# Altium footprint library OXI_ONE.PcbLib: 74 footprints (part 5 of 5)
Each footprint in its own frame and in the unit in brackets; x right, y up, seen from the top. Pads: shape width x height; smd on the part's side, far side on the other; paste and mask are expansions set on the pad; w line width, h text height; cw(c..) or ccw(c..) is an arc to the next point about the centre after c.
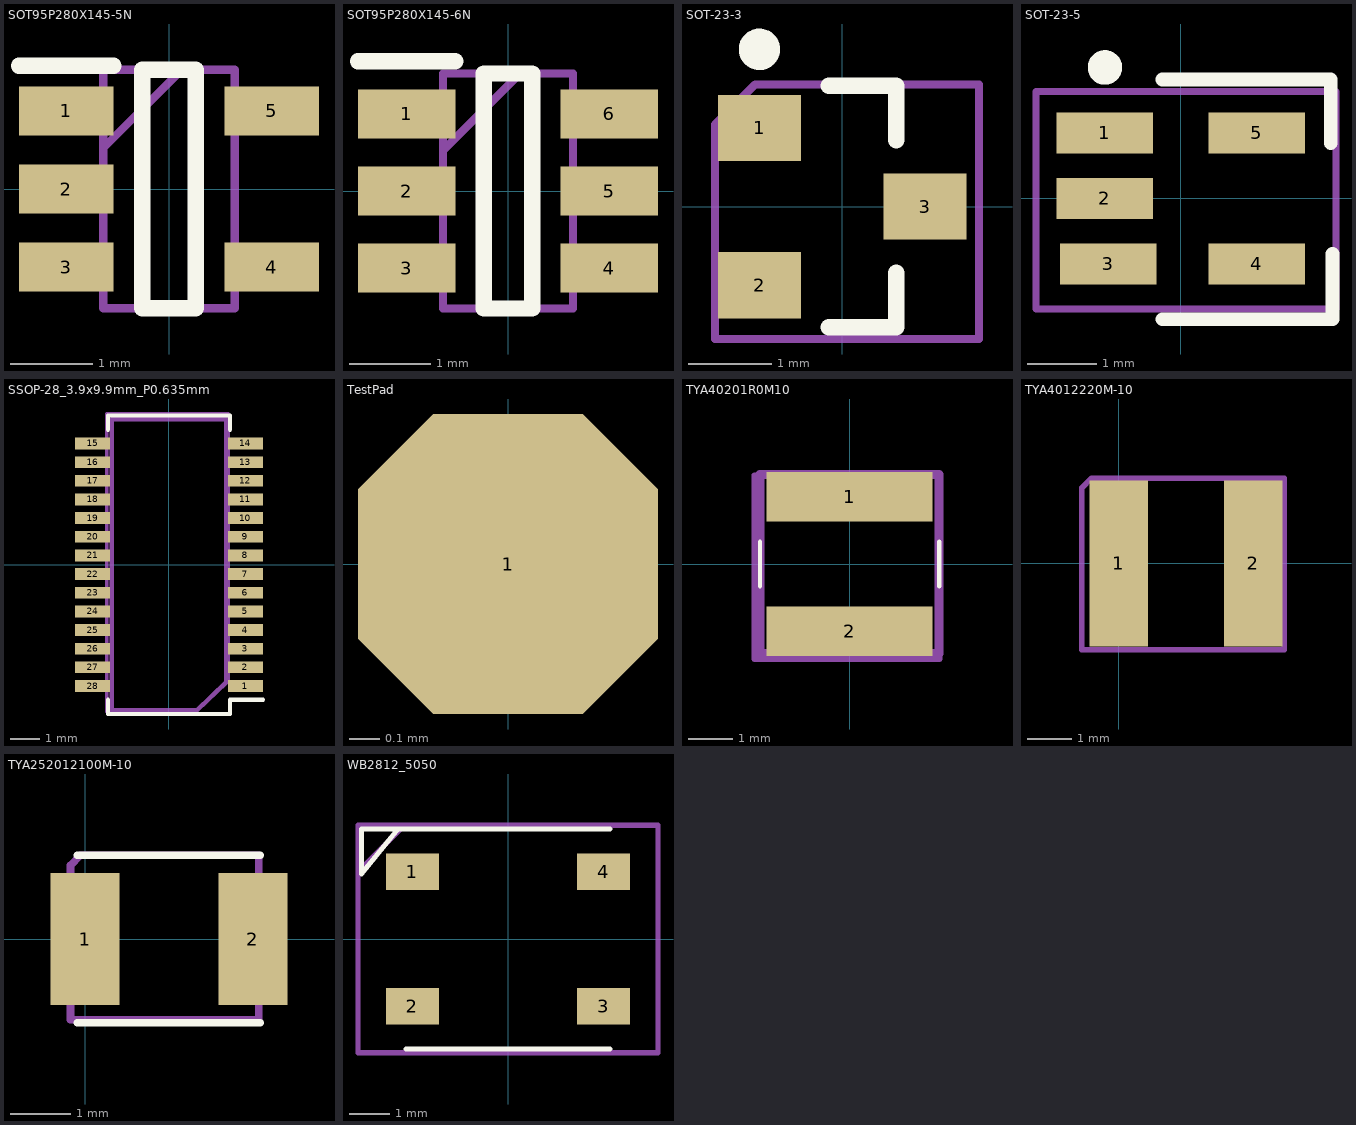
[diagram p4: the footprints below, top view; thin cyan lines are the x and y axes]

## SOT95P280X145-5N [mm]
pads (5):
  rect 1.15x0.6 smd: 1(-1.25,0.95) 2(-1.25,0) 3(-1.25,-0.95) 4(1.25,-0.95) 5(1.25,0.95)
Top Overlay:
  lines w0.2: -1.825,1.5 -0.675,1.5 ; -0.325,-1.45 -0.325,1.45 0.325,1.45 0.325,-1.45 -0.325,-1.45
Top Assembly (Mech29):
  lines w0.1: -0.8,0.5 0.15,1.45 ; -0.8,-1.45 -0.8,1.45 0.8,1.45 0.8,-1.45 -0.8,-1.45
  text ".Designator" at 0.381,-1.27 h1
3D body "MCP1811AT-020_OT.stp": height 1.45, standoff 0, extent -1.4,-1.45 1.4,1.45

## SOT95P280X145-6N [mm]
pads (6):
  rect 1.2x0.6 smd: 1(-1.25,0.95) 2(-1.25,0) 3(-1.25,-0.95) 4(1.25,-0.95) 5(1.25,0) 6(1.25,0.95)
Top Overlay:
  lines w0.2: -1.85,1.6 -0.65,1.6 ; -0.3,-1.45 0.3,-1.45 0.3,1.45 -0.3,1.45 -0.3,-1.45
Top Assembly (Mech29):
  lines w0.1: -0.8,0.5 0.15,1.45 ; -0.8,-1.45 0.8,-1.45 0.8,1.45 -0.8,1.45 -0.8,-1.45
  text ".Designator" at 0.381,-1.397 h1
3D body "TPD3S014DBVR.stp": height 1.45, standoff 0, extent -1.4,-1.45 1.4,1.45

## SOT-23-3 [mm] "SOT23, 3-Leads, Body 2.92x1.3mm, Pitch 0.95mm"
height 1.11
pads (3):
  rect 1x0.8 smd: 1(-1,0.95) 2(-1,-0.95) 3(1,0)
Top Overlay:
  circle w0.25: c-1,1.9 r0.125
  lines w0.2: -0.165,-1.46 0.65,-1.46 0.65,-0.8 ; -0.165,1.46 0.65,1.46 0.65,0.8
Top Assembly (Mech29):
  lines w0.1: -1.537,-1.6 1.651,-1.6 1.651,1.475 -1.052,1.475 -1.537,0.991 -1.537,-1.6
  text ".Designator" at -0.254,1.143 h1
3D body "SOT23-3.step": height 1.3, standoff 0, extent -1.4,-1.45 1.4,1.45

## SOT-23-5 [mm] "SOT23, 3-Leads, Body 2.92x1.3mm, Pitch 0.95mm"
height 1.11
pads (5):
  rect 1.4x0.6 smd: 1(-1.1,0.95) 2(-1.1,0) 3(-1.05,-0.95) 4(1.1,-0.95) 5(1.1,0.95)
Top Overlay:
  circle w0.25: c-1.1,1.9 r0.125
  lines w0.2: -0.265,-1.75 2.2,-1.75 2.2,-0.8 ; -0.265,1.725 2.175,1.725 2.175,0.8
Top Assembly (Mech29):
  lines w0.1: -2.1,-1.6 -2.1,1.55 2.25,1.55 2.25,-1.6 -2.1,-1.6
  text ".Designator" at -0.381,1.143 h1
3D body "SOT-23-5.step": height 1.05, standoff -0.05, extent -1.175,-1.5 1.325,1.5

## SSOP-28_3.9x9.9mm_P0.635mm [mm]
pads (28):
  rect 1.2x0.4 smd mask+0.051: 1(2.6,-4.127) 2(2.6,-3.492) 3(2.6,-2.857) 4(2.6,-2.222) 5(2.6,-1.587) 6(2.6,-0.953) 7(2.6,-0.318) 8(2.6,0.318) 9(2.6,0.953) 10(2.6,1.587) 11(2.6,2.222) 12(2.6,2.857) 13(2.6,3.492) 14(2.6,4.127) 15(-2.6,4.127) 16(-2.6,3.492) 17(-2.6,2.857) 18(-2.6,2.222) 19(-2.6,1.587) 20(-2.6,0.953) 21(-2.6,0.318) 22(-2.6,-0.318) 23(-2.6,-0.953) 24(-2.6,-1.587) 25(-2.6,-2.222) 26(-2.6,-2.857) 27(-2.6,-3.492) 28(-2.6,-4.127)
Top Overlay:
  lines w0.15: -2.075,-4.6 -2.075,-5.08 2.075,-5.08 2.075,-4.6 3.2,-4.6 ; -2.075,4.6 -2.075,5.08 2.075,5.08 2.075,4.6
Bottom Assembly:
  lines w0.15: -1.95,-4.95 0.95,-4.95 1.95,-4 1.95,4.95 -1.95,4.95 -1.95,-4.95
Top Assembly (Mech29):
  lines w0.127: -2.118,-5.004 -2.118,5.131 2.007,5.131 2.007,-3.912 0.914,-5.004 -2.118,-5.004
  text ".Designator" at 0.381,-1.778 h1

## TestPad [mm]
pads (1):
  oct 1x1 smd paste-2: 1(0,0)

## TYA40201R0M10 [mm]
pads (2):
  rect 3.7x1.1 smd: 1(0,1.5) 2(0,-1.5)
Top Overlay:
  lines w0.1: -2,-0.5 -2,0.5 ; 2,-0.5 2,0.5
Mechanical 13:
  lines w0.2: -2,-2 -2,2 2,2 2,-2 -2,-2
Top Assembly (Mech29):
  lines w0.127: -2.121,-2.121 2.007,-2.121 2.007,1.981 -2.121,1.981 -2.121,-2.121
  text ".Designator" at -2.032,-0.508 h1
3D body "TYA40201R0M-10.stp": height 2.2, standoff 0, extent -2,-2 2,2

## TYA4012220M-10 [mm]
pads (2):
  rect 1.3x3.7 smd: 1(0,0) 2(3,0)
Top Assembly (Mech29):
  lines w0.127: -0.826,-1.93 3.696,-1.93 3.696,1.905 -0.61,1.905 -0.826,1.689 -0.826,-1.93
  text ".Designator" at -0.635,-0.381 h1
3D body "User Library-IndLQS_4012.STEP": height 1.17, standoff -0.03, extent -0.476,-2 3.524,2

## TYA252012100M-10 [mm]
pads (2):
  rect 1.15x2.2 smd: 1(0,0) 2(2.8,0)
Top Overlay:
  lines w0.127: -0.127,-1.397 2.921,-1.397 ; -0.127,1.397 2.921,1.397
Top Assembly (Mech29):
  lines w0.127: -0.241,-1.346 -0.241,1.232 -0.076,1.397 2.896,1.397 2.896,-1.346 -0.241,-1.346
  text ".Designator" at 0.381,-0.508 h1
3D body "User Library-1008CS.step": height 2.01, standoff -0.02, extent -0.063,-1.395 2.857,1.395

## WB2812_5050 [mm]
pads (4):
  rect 1.3x0.9 smd mask+0.102: 1(-2.35,1.65) 2(-2.35,-1.65) 3(2.35,-1.65) 4(2.35,1.65)
Top Overlay:
  lines w0.12: -2.7,2.7 -3.6,1.6 -3.6,2.7 2.5,2.7 ; -2.5,-2.7 2.5,-2.7
Mechanical 4:
  lines w0.05: -3.65,-2.75 3.65,-2.75 3.65,2.75 -3.65,2.75 -3.65,-2.75
Top Assembly (Mech29):
  lines w0.127: -2.54,2.794 -3.683,1.651 -3.683,1.524 ; -3.683,1.524 -3.683,2.794 3.683,2.794 3.683,-2.794 -3.683,-2.794 -3.683,1.524
  text ".Designator" at -2.54,-2.54 h1
  text "Edge with the edge of the LED" at -3.175,-0.127 h1
3D body "User Library-ws2812B-1.step": height 1.55, standoff -0.02, extent -2.7,-2.5 2.7,2.5